# Altium footprint library coenv_PCBLIB.PcbLib: 25 footprints (part 1 of 2)
Each footprint in its own frame and in the unit in brackets; x right, y up, seen from the top. Pads: shape width x height; smd on the part's side, far side on the other; paste and mask are expansions set on the pad; w line width, h text height; cw(c..) or ccw(c..) is an arc to the next point about the centre after c.
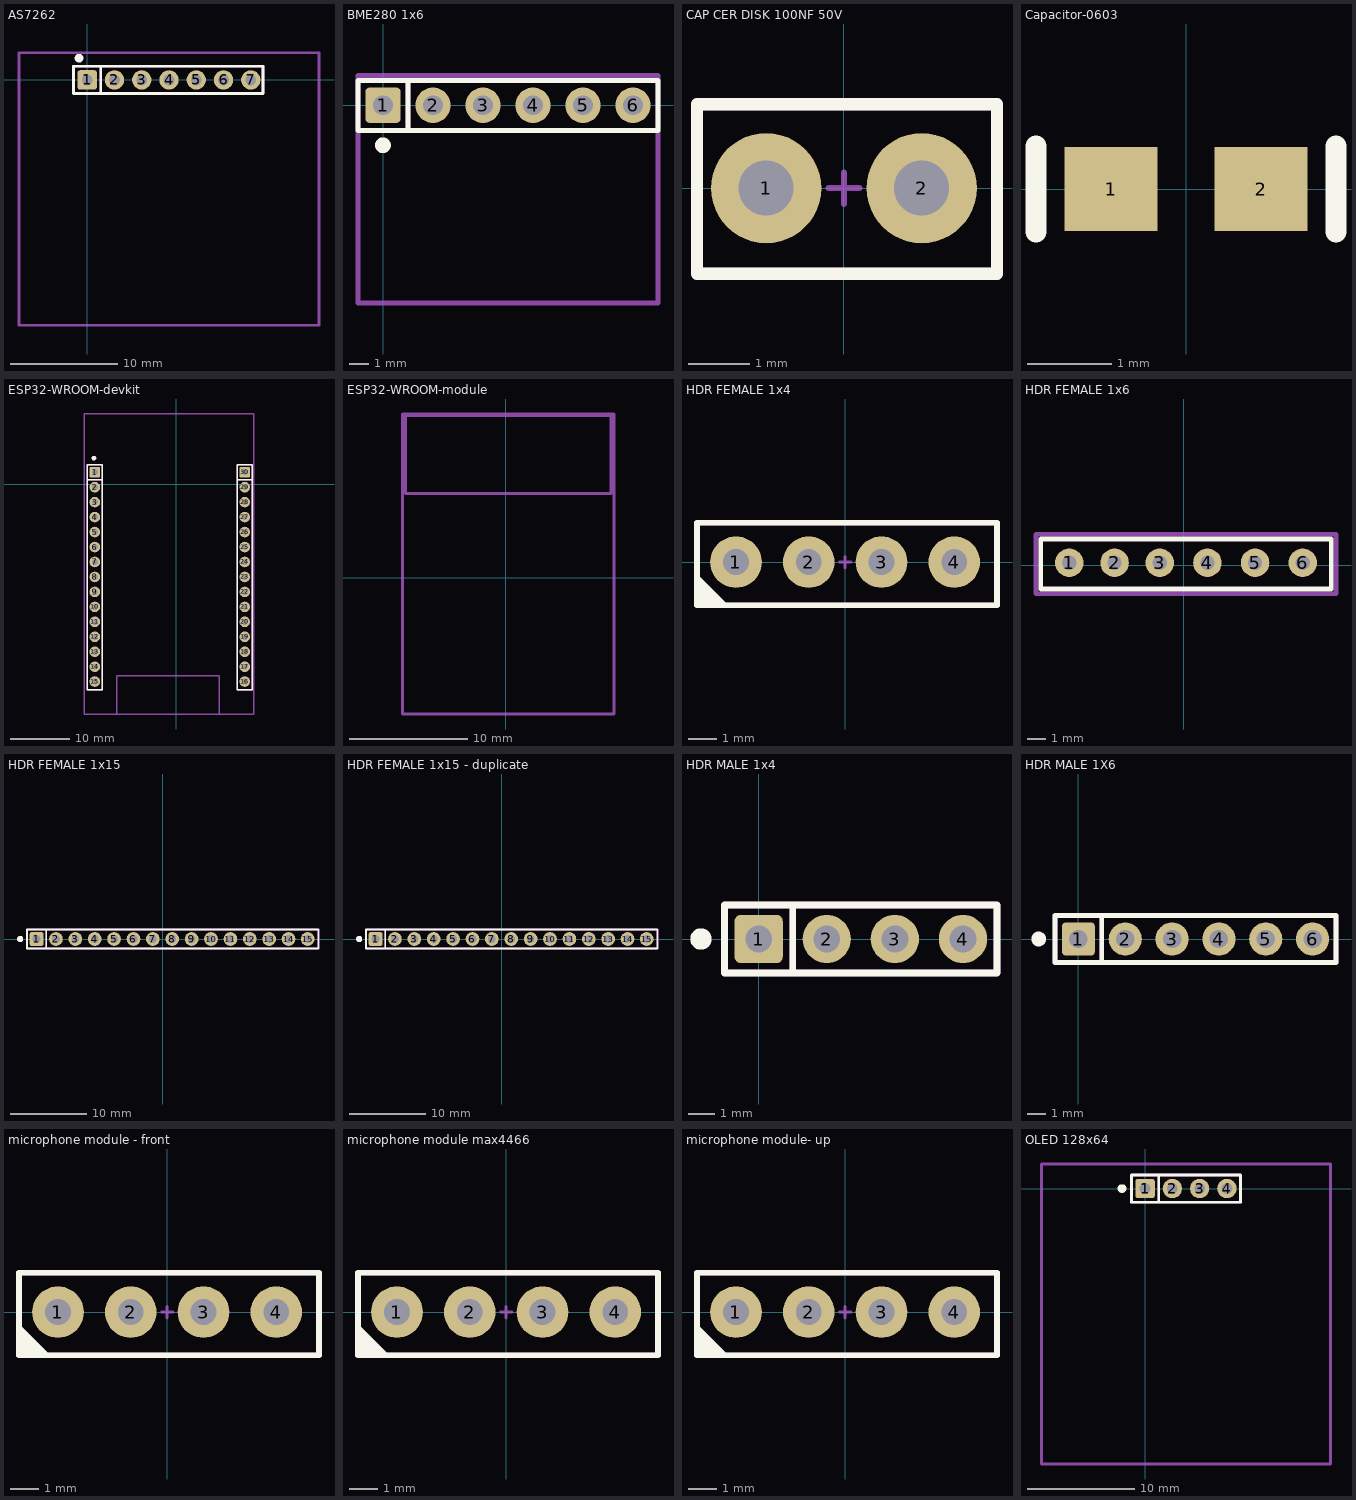
[diagram p0: the footprints below, top view; thin cyan lines are the x and y axes]

## AS7262 [mm] "PinHeader 1x6 TH Pitch 2.54mm"
height 9.5
pads (7):
  rrect25% 1.8x1.8 hole 1: 1(0,0)
  round 1.8 hole 1: 2(2.54,0) 3(5.08,0) 4(7.62,0) 5(10.16,0) 6(12.7,0) 7(15.24,0)
Top Overlay:
  circle w0.5: c-0.762,2.032 r0.15
  lines w0.254: 1.27,-1.27 1.27,1.27 -1.27,1.27 ; -1.27,1.27 16.383,1.27 16.383,-1.27 -1.27,-1.27 -1.27,1.27
Mechanical 3:
  lines w0.254: 1.27,-1.27 1.27,1.27 -1.27,1.27 ; -1.27,1.27 16.383,1.27 16.383,-1.27 -1.27,-1.27 -1.27,1.27
Mechanical 13:
  lines w0.254: -6.35,-22.86 -6.35,2.54 21.59,2.54 21.59,-22.86 -6.35,-22.86
3D body "Pin Header 1x3 TH Pitch 2.54mm.stp": height 5.99, standoff -6.7, extent 8.763,-1.27 16.383,1.27
3D body "Pin Header 1x3 TH Pitch 2.54mm.stp": height 5.99, standoff -6.7, extent 3.81,-1.27 11.43,1.27
3D body "Pin Header 1x3 TH Pitch 2.54mm.stp": height 5.99, standoff -6.7, extent -1.27,-1.27 6.35,1.27
3D body "SHT31-D v1.step": height 5.4, standoff 2.54, extent -1.38,-10.16 16.62,2.54

## BME280 1x6 [mm] "PinHeader 1x6 TH Pitch 2.54mm"
height 9.5
pads (6):
  rrect25% 1.8x1.8 hole 1: 1(0,0)
  round 1.8 hole 1: 2(2.54,0) 3(5.08,0) 4(7.62,0) 5(10.16,0) 6(12.7,0)
Top Overlay:
  circle w0.5: c0,-2.032 r0.15
  lines w0.254: 1.27,-1.27 1.27,1.27 -1.27,1.27 ; -1.27,1.27 13.97,1.27 13.97,-1.27 -1.27,-1.27 -1.27,1.27
Mechanical 3:
  lines w0.254: 1.27,-1.27 1.27,1.27 -1.27,1.27 ; -1.27,1.27 13.97,1.27 13.97,-1.27 -1.27,-1.27 -1.27,1.27
Mechanical 15:
  lines w0.254: -1.27,-10.033 13.97,-10.033 13.97,1.524 -1.27,1.524 -1.27,-10.033
3D body "Pin Header 1x6 TH Pitch 2.54mm.stp": height 6.25, standoff -6.45, extent -1.27,-1.27 13.97,1.27
3D body "P280, 6-PIN-Version v4.step": height 5.54, standoff 3.01, extent -1.3,-10.033 14,1.467

## CAP CER DISK 100NF 50V [mm] "Connector; Header; 5 Position"
pads (2):
  round 1.8 hole 0.9: 1(-1.27,0) 2(1.27,0)
Top Overlay:
  lines w0.2: -2.4,-1.397 -2.4,1.37 2.5,1.37 2.5,-1.397 -2.4,-1.397
Mechanical 15:
  lines w0.1: -0.254,0 0.254,0 ; 0,-0.254 0,0.254
  lines w0.2: -2.4,-1.397 2.5,-1.397 2.5,1.37 -2.4,1.37 -2.4,-1.397
Mechanical 29:
  text ".Designator" at -2.2,1.8 h0.5
  text "1" at -0.4,-1.1 h0.5
3D body "CAP_Ceramic.STEP": height 6.1, standoff -3.93, extent -2.28,-1.25 2.42,1.25

## Capacitor-0603 [mm] "Chip Capacitor; Body 1.6 x 0.8 mm (LxW typ)"
height 0.87
pads (2):
  rect 1.1x1 smd: 1(-0.889,0) 2(0.889,0)
Top Overlay:
  lines w0.254: -1.778,-0.508 -1.778,0.508 ; 1.778,-0.508 1.778,0.508
3D body "cap0603.STEP": height 0.89, standoff -0.01, extent -1.27,-0.508 1.33,0.492

## ESP32-WROOM-devkit [mm]
pads (30):
  rrect25% 1.8x1.8 hole 1: 1(-13.843,2.032) 30(11.584,2.032)
  round 1.8 hole 1: 2(-13.843,-0.508) 3(-13.843,-3.048) 4(-13.843,-5.588) 5(-13.843,-8.128) 6(-13.843,-10.668) 7(-13.843,-13.208) 8(-13.843,-15.748) 9(-13.843,-18.288) 10(-13.843,-20.828) 11(-13.843,-23.368) 12(-13.843,-25.908) 13(-13.843,-28.448) 14(-13.843,-30.988) 15(-13.843,-33.488) 16(11.584,-33.488) 17(11.584,-30.988) 18(11.584,-28.448) 19(11.584,-25.908) 20(11.584,-23.368) 21(11.584,-20.828) 22(11.584,-18.288) 23(11.584,-15.748) 24(11.584,-13.208) 25(11.584,-10.668) 26(11.584,-8.128) 27(11.584,-5.588) 28(11.584,-3.048) 29(11.584,-0.508)
Top Overlay:
  circle w0.5: c-14,4.4 r0.15
  lines w0.254: -15.113,0.762 -12.573,0.762 -12.573,3.302 ; 10.314,0.762 12.854,0.762 12.854,3.302 ; -12.573,3.302 -15.113,3.302 -15.113,-34.878 -12.573,-34.878 -12.573,3.302 ; 12.854,3.302 10.314,3.302 10.314,-34.878 12.854,-34.878 12.854,3.302
Mechanical 3:
  lines w0.254: -15.113,0.762 -12.573,0.762 -12.573,3.302 ; 10.314,0.762 12.854,0.762 12.854,3.302 ; -12.573,3.302 -15.113,3.302 -15.113,-34.978 -12.573,-34.978 -12.573,3.302 ; 12.854,3.302 10.314,3.302 10.314,-34.978 12.854,-34.978 12.854,3.302
Mechanical 13:
  lines w0.254: -10.16,-39 7.239,-39 7.239,-32.512 -10.16,-32.512 -10.16,-39
Mechanical 15:
  lines w0.254: -15.6,-39 -15.6,11.9 13.081,11.9 13.081,-39 -15.6,-39
3D body "ESP-WROOM32.STEP": height 6.94, standoff -5.46, extent -15.646,-38.954 12.854,11.976

## ESP32-WROOM-module [mm]
Mechanical 13:
  lines w0.254: -8.509,7.112 -8.509,13.716 8.89,13.716 8.89,7.112 -8.509,7.112
Mechanical 15:
  lines w0.254: -8.763,-11.557 -8.763,13.843 9.144,13.843 9.144,-11.557 -8.763,-11.557
3D body "ESP-32 .step": height 2.61, standoff -0.1, extent -8.823,-11.557 9.077,13.843

## HDR FEMALE 1x4 [mm] "Connector; Header; 4 Position"
pads (4):
  round 1.8 hole 0.9: 1(-3.81,0) 2(-1.27,0) 3(1.27,0) 4(3.81,0)
Top Overlay:
  region: -5.17,-1.5 -4.572,-1.5 -4.088,-1.5 -5.17,-0.418
  lines w0.2: -5.17,-1.5 5.3,-1.5 5.3,1.37 -5.17,1.37 -5.17,-1.5
Mechanical 15:
  lines w0.1: -0.2,0 0.2,0 ; 0,-0.2 0,0.2
  lines w0.2: -5.17,-1.5 -5.17,1.37 5.3,1.37 5.3,-1.5 -5.17,-1.5
Mechanical 29:
  text "1" at -2.794,-1.143 h0.5
  text ".Designator" at -4.97,1.87 h0.5
3D body "HDR FEMALE 1x4.STEP": height 8.5, standoff -2.09, extent -5,-1.3 5.16,1.24

## HDR FEMALE 1x6 [mil]
pads (6):
  round 60 hole 30: 1(-240,5) 2(-145,5) 3(-50,5) 4(50,5) 5(150,5) 6(250,5)
Top Overlay:
  lines w10: -300,-50 -300,55 310,55 310,-50 -300,-50
Mechanical 15:
  lines w10: -310,-60 -310,65 320,65 320,-60 -310,-60
3D body "female_header_a-bl254-eg-g06d.stp": height 334.65, standoff -125.98, extent -304.92,-45 304.92,53.43

## HDR FEMALE 1x15 [mm]
pads (15):
  rrect25% 1.8x1.8 hole 1: 1(-16.51,0)
  round 1.8 hole 1: 2(-13.97,0) 3(-11.43,0) 4(-8.89,0) 5(-6.35,0) 6(-3.81,0) 7(-1.27,0) 8(1.27,0) 9(3.81,0) 10(6.35,0) 11(8.89,0) 12(11.43,0) 13(13.97,0) 14(16.51,0) 15(19.01,0)
Top Overlay:
  circle w0.5: c-18.66,0 r0.15
  lines w0.254: -15.24,-1.27 -15.24,1.27 -17.78,1.27 ; -17.78,1.27 20.4,1.27 20.4,-1.27 -17.78,-1.27 -17.78,1.27
Mechanical 3:
  lines w0.254: -15.24,-1.27 -15.24,1.27 -17.78,1.27 ; -17.78,1.27 20.5,1.27 20.5,-1.27 -17.78,-1.27 -17.78,1.27
3D body "female_header_a-bl254-eg-g03d.stp": height 8.5, standoff -3.2, extent -17.8,-1.4 -9.93,1.1
3D body "female_header_a-bl254-eg-g03d.stp": height 8.5, standoff -3.2, extent -10.235,-1.4 -2.365,1.1
3D body "female_header_a-bl254-eg-g03d.stp": height 8.5, standoff -3.2, extent -2.735,-1.4 5.135,1.1
3D body "female_header_a-bl254-eg-g03d.stp": height 8.5, standoff -3.2, extent 4.865,-1.4 12.735,1.1
3D body "female_header_a-bl254-eg-g03d.stp": height 8.5, standoff -3.2, extent 12.565,-1.4 20.435,1.1

## HDR FEMALE 1x15 - duplicate [mm]
pads (15):
  rrect25% 1.8x1.8 hole 1: 1(-16.51,0)
  round 1.8 hole 1: 2(-13.97,0) 3(-11.43,0) 4(-8.89,0) 5(-6.35,0) 6(-3.81,0) 7(-1.27,0) 8(1.27,0) 9(3.81,0) 10(6.35,0) 11(8.89,0) 12(11.43,0) 13(13.97,0) 14(16.51,0) 15(19.01,0)
Top Overlay:
  circle w0.5: c-18.66,0 r0.15
  lines w0.254: -15.24,-1.27 -15.24,1.27 -17.78,1.27 ; -17.78,1.27 20.4,1.27 20.4,-1.27 -17.78,-1.27 -17.78,1.27
Mechanical 3:
  lines w0.254: -15.24,-1.27 -15.24,1.27 -17.78,1.27 ; -17.78,1.27 20.5,1.27 20.5,-1.27 -17.78,-1.27 -17.78,1.27
3D body "female_header_a-bl254-eg-g03d.stp": height 8.5, standoff -3.2, extent -17.8,-1.4 -9.93,1.1
3D body "female_header_a-bl254-eg-g03d.stp": height 8.5, standoff -3.2, extent -10.235,-1.4 -2.365,1.1
3D body "female_header_a-bl254-eg-g03d.stp": height 8.5, standoff -3.2, extent -2.735,-1.4 5.135,1.1
3D body "female_header_a-bl254-eg-g03d.stp": height 8.5, standoff -3.2, extent 4.865,-1.4 12.735,1.1
3D body "female_header_a-bl254-eg-g03d.stp": height 8.5, standoff -3.2, extent 12.565,-1.4 20.435,1.1

## HDR MALE 1x4 [mm] "PinHeader 1x4 TH Pitch 2.54mm"
height 9.5
pads (4):
  rrect25% 1.8x1.8 hole 1: 1(0,0)
  round 1.8 hole 1: 2(2.54,0) 3(5.08,0) 4(7.62,0)
Top Overlay:
  circle w0.5: c-2.15,0 r0.15
  lines w0.254: 1.27,-1.27 1.27,1.27 -1.27,1.27 ; -1.27,1.27 -1.27,-1.27 8.89,-1.27 8.89,1.27 -1.27,1.27
Mechanical 3:
  lines w0.254: 1.27,-1.27 1.27,1.27 -1.27,1.27 ; -1.27,1.27 -1.27,-1.27 8.89,-1.27 8.89,1.27 -1.27,1.27
3D body "Pin Header 1x4 TH Pitch 2.54mm.stp": height 9.5, standoff -3.2, extent -1.27,-1.27 8.89,1.27

## HDR MALE 1X6 [mm] "PinHeader 1x6 TH Pitch 2.54mm"
height 9.5
pads (6):
  rrect25% 1.8x1.8 hole 1: 1(0,0)
  round 1.8 hole 1: 2(2.54,0) 3(5.08,0) 4(7.62,0) 5(10.16,0) 6(12.7,0)
Top Overlay:
  circle w0.5: c-2.15,0 r0.15
  lines w0.254: 1.27,-1.27 1.27,1.27 -1.27,1.27 ; -1.27,1.27 13.97,1.27 13.97,-1.27 -1.27,-1.27 -1.27,1.27
Mechanical 3:
  lines w0.254: 1.27,-1.27 1.27,1.27 -1.27,1.27 ; -1.27,1.27 13.97,1.27 13.97,-1.27 -1.27,-1.27 -1.27,1.27
3D body "Pin Header 1x6 TH Pitch 2.54mm.stp": height 9.5, standoff -3.2, extent -1.27,-1.27 13.97,1.27

## microphone module - front [mm] "Connector; Header; 4 Position"
pads (4):
  round 1.8 hole 0.9: 1(-3.81,0) 2(-1.27,0) 3(1.27,0) 4(3.81,0)
Top Overlay:
  region: -5.17,-1.5 -4.572,-1.5 -4.088,-1.5 -5.17,-0.418
  lines w0.2: -5.17,-1.5 -5.17,1.37 5.3,1.37 5.3,-1.5 -5.17,-1.5
Mechanical 15:
  lines w0.1: -0.2,0 0.2,0 ; 0,-0.2 0,0.2
  lines w0.2: -5.17,-1.5 5.3,-1.5 5.3,1.37 -5.17,1.37 -5.17,-1.5
3D body "HDR FEMALE 1x4.STEP": height 8.13, standoff 5.59, extent -5.126,-9.778 5.034,0.816
3D body "HDR FEMALE 1x4.STEP": height 8.5, standoff -2.09, extent -5.18,-1.24 4.98,1.3
3D body "Microphone Module.SLDPRT": height 14.12, standoff -0.47, extent -7,-46.615 8,-4.585

## microphone module max4466 [mm] "Connector; Header; 4 Position"
pads (4):
  round 1.8 hole 0.9: 1(-3.81,0) 2(-1.27,0) 3(1.27,0) 4(3.81,0)
Top Overlay:
  region: -5.17,-1.5 -4.572,-1.5 -4.088,-1.5 -5.17,-0.418
  lines w0.2: -5.17,-1.5 5.3,-1.5 5.3,1.37 -5.17,1.37 -5.17,-1.5
Mechanical 15:
  lines w0.1: -0.2,0 0.2,0 ; 0,-0.2 0,0.2
  lines w0.2: -5.17,-1.5 -5.17,1.37 5.3,1.37 5.3,-1.5 -5.17,-1.5
3D body "HDR FEMALE 1x4.STEP": height 8.5, standoff -2.09, extent -4.873,-1.3 5.287,1.24
3D body "Max4466.STEP": height 17.35, standoff 2.75, extent -5.685,-20 8.285,1.59

## microphone module- up [mm] "Connector; Header; 4 Position"
pads (4):
  round 1.8 hole 0.9: 1(-3.81,0) 2(-1.27,0) 3(1.27,0) 4(3.81,0)
Top Overlay:
  region: -5.17,-1.5 -4.572,-1.5 -4.088,-1.5 -5.17,-0.418
  lines w0.2: -5.17,-1.5 -5.17,1.37 5.3,1.37 5.3,-1.5 -5.17,-1.5
Mechanical 15:
  lines w0.1: -0.2,0 0.2,0 ; 0,-0.2 0,0.2
  lines w0.2: -5.17,-1.5 5.3,-1.5 5.3,1.37 -5.17,1.37 -5.17,-1.5
3D body "Microphone Module.SLDPRT": height 44.26, standoff 2.23, extent -7.493,-7.421 7.507,7.167
3D body "HDR FEMALE 1x4.STEP": height 8.5, standoff -2.09, extent -4.873,-1.3 5.287,1.24

## OLED 128x64 [mm] "PinHeader 1x4 TH Pitch 2.54mm"
height 9.5
pads (4):
  rrect25% 1.8x1.8 hole 1: 1(0,0)
  round 1.8 hole 1: 2(2.54,0) 3(5.08,0) 4(7.62,0)
Top Overlay:
  circle w0.5: c-2.15,0 r0.15
  lines w0.254: 1.27,-1.27 1.27,1.27 -1.27,1.27 ; -1.27,1.27 8.89,1.27 8.89,-1.27 -1.27,-1.27 -1.27,1.27
Mechanical 3:
  lines w0.254: 1.27,-1.27 1.27,1.27 -1.27,1.27 ; -1.27,1.27 8.89,1.27 8.89,-1.27 -1.27,-1.27 -1.27,1.27
Mechanical 15:
  lines w0.254: -9.652,-25.654 17.272,-25.654 17.272,2.286 -9.652,2.286 -9.652,-25.654
3D body "OLED-128x64-0.96.step": height 5.28, standoff -5.56, extent -9.525,-25.614 17.175,2.246